# Altium integrated library Samtec_2,54_mm_Pitch_Socket_Strips.IntLib: 489 symbols (part 3 of 4) (continued)
## SSQ-107-02-F-D-RA (continued)
SQ Post Socket, Through-hole, Right Angle, -55 to 125 degC, 2.54 mm Pitch, 14-Pin, Female, RoHS; Manufacturer: Samtec; PartNumber: SSQ-107-02-F-D-RA; Pitch: 2.54 mm; DatasheetVersion: F-214; PackageVersion: BD, 6/1987; PackageReference: SSQ-107-02-X-D-RA; PackageDescription: Assembly, Socket Strip .025[0.64] SQ Tail; Orientation: Right Angle; RoHS: True; Temperature Range: -55 to 125 degC; Mounting Technology: Through-hole; ComponentLink1Description: Manufacturer URL; ComponentLink1URL: http://www.samtec.com; ComponentLink2Description: Datasheet; ComponentLink2URL: http://www.samtec.com/documents/webfiles/pdf/SSQ_TH.PDF; ComponentLink3Description: Package Specification; ComponentLink3URL: http://www.samtec.com/documents/webfiles/cpdf/SSQ-1XX-XX-XXX-X-XX-XXX-XX-X-MKT.pdf
footprint SMTC-SSQ-107-02-X-D-RA (SQ Post Socket, 2x7 Pins, Right Angle, 2.54mm Pitch, Female)
pins: 1, 2, 3, 4, 5, 6, 7, 8, 9, 10, 11, 12, 13, 14

## SSQ-107-02-G-D-RA
designator J?
SQ Post Socket, Through-hole, Right Angle, -55 to 125 degC, 2.54 mm Pitch, 14-Pin, Female, RoHS; Manufacturer: Samtec; PartNumber: SSQ-107-02-G-D-RA; Pitch: 2.54 mm; DatasheetVersion: F-214; PackageVersion: BD, 6/1987; PackageReference: SSQ-107-02-X-D-RA; PackageDescription: Assembly, Socket Strip .025[0.64] SQ Tail; Supplier 1: Digi-Key; Supplier Part Number 1: SAM1186-07-ND; Orientation: Right Angle; RoHS: True; Temperature Range: -55 to 125 degC; Mounting Technology: Through-hole; ComponentLink1Description: Manufacturer URL; ComponentLink1URL: http://www.samtec.com; ComponentLink2Description: Datasheet; ComponentLink2URL: http://www.samtec.com/documents/webfiles/pdf/SSQ_TH.PDF; ComponentLink3Description: Package Specification; ComponentLink3URL: http://www.samtec.com/documents/webfiles/cpdf/SSQ-1XX-XX-XXX-X-XX-XXX-XX-X-MKT.pdf
footprint SMTC-SSQ-107-02-X-D-RA (SQ Post Socket, 2x7 Pins, Right Angle, 2.54mm Pitch, Female)
pins: 1, 2, 3, 4, 5, 6, 7, 8, 9, 10, 11, 12, 13, 14

## SSQ-107-02-L-D-RA
designator J?
SQ Post Socket, Through-hole, Right Angle, -55 to 125 degC, 2.54 mm Pitch, 14-Pin, Female, RoHS; Manufacturer: Samtec; PartNumber: SSQ-107-02-L-D-RA; Pitch: 2.54 mm; DatasheetVersion: F-214; PackageVersion: BD, 6/1987; PackageReference: SSQ-107-02-X-D-RA; PackageDescription: Assembly, Socket Strip .025[0.64] SQ Tail; Orientation: Right Angle; RoHS: True; Temperature Range: -55 to 125 degC; Mounting Technology: Through-hole; ComponentLink1Description: Manufacturer URL; ComponentLink1URL: http://www.samtec.com; ComponentLink2Description: Datasheet; ComponentLink2URL: http://www.samtec.com/documents/webfiles/pdf/SSQ_TH.PDF; ComponentLink3Description: Package Specification; ComponentLink3URL: http://www.samtec.com/documents/webfiles/cpdf/SSQ-1XX-XX-XXX-X-XX-XXX-XX-X-MKT.pdf
footprint SMTC-SSQ-107-02-X-D-RA (SQ Post Socket, 2x7 Pins, Right Angle, 2.54mm Pitch, Female)
pins: 1, 2, 3, 4, 5, 6, 7, 8, 9, 10, 11, 12, 13, 14

## SSQ-107-02-T-D-RA
designator J?
SQ Post Socket, Through-hole, Right Angle, -55 to 105 degC, 2.54 mm Pitch, 14-Pin, Female, RoHS; Manufacturer: Samtec; PartNumber: SSQ-107-02-T-D-RA; Pitch: 2.54 mm; DatasheetVersion: F-214; PackageVersion: BD, 6/1987; PackageReference: SSQ-107-02-X-D-RA; PackageDescription: Assembly, Socket Strip .025[0.64] SQ Tail; Supplier 1: Digi-Key; Supplier Part Number 1: SAM1224-07-ND; Orientation: Right Angle; RoHS: True; Temperature Range: -55 to 105 degC; Mounting Technology: Through-hole; ComponentLink1Description: Manufacturer URL; ComponentLink1URL: http://www.samtec.com; ComponentLink2Description: Datasheet; ComponentLink2URL: http://www.samtec.com/documents/webfiles/pdf/SSQ_TH.PDF; ComponentLink3Description: Package Specification; ComponentLink3URL: http://www.samtec.com/documents/webfiles/cpdf/SSQ-1XX-XX-XXX-X-XX-XXX-XX-X-MKT.pdf
footprint SMTC-SSQ-107-02-X-D-RA (SQ Post Socket, 2x7 Pins, Right Angle, 2.54mm Pitch, Female)
pins: 1, 2, 3, 4, 5, 6, 7, 8, 9, 10, 11, 12, 13, 14

## SSQ-108-01-F-S
designator J?
SQ Post Socket, Through-hole, Vertical, -55 to 125 degC, 2.54 mm Pitch, 8-Pin, Female, RoHS; Manufacturer: Samtec; PartNumber: SSQ-108-01-F-S; Pitch: 2.54 mm; DatasheetVersion: F-214; PackageVersion: BD, 6/1987; PackageReference: SSQ-108-01-X-S; PackageDescription: Assembly, Socket Strip .025[0.64] SQ Tail; Orientation: Vertical; RoHS: True; Temperature Range: -55 to 125 degC; Mounting Technology: Through-hole; ComponentLink1Description: Manufacturer URL; ComponentLink1URL: http://www.samtec.com; ComponentLink2Description: Datasheet; ComponentLink2URL: http://www.samtec.com/documents/webfiles/pdf/SSQ_TH.PDF; ComponentLink3Description: Package Specification; ComponentLink3URL: http://www.samtec.com/documents/webfiles/cpdf/SSQ-1XX-XX-XXX-X-XX-XXX-XX-X-MKT.pdf
footprint SMTC-SSQ-108-01-X-S (SQ Post Socket, 1x8 Pins, Vertical, 2.54mm Pitch, Female)
pins: 1, 2, 3, 4, 5, 6, 7, 8

## SSQ-108-01-G-S
designator J?
SQ Post Socket, Through-hole, Vertical, -55 to 125 degC, 2.54 mm Pitch, 8-Pin, Female, RoHS; Manufacturer: Samtec; PartNumber: SSQ-108-01-G-S; Pitch: 2.54 mm; DatasheetVersion: F-214; PackageVersion: BD, 6/1987; PackageReference: SSQ-108-01-X-S; PackageDescription: Assembly, Socket Strip .025[0.64] SQ Tail; Supplier 1: Digi-Key; Supplier Part Number 1: SAM1180-08-ND; Supplier 2: Farnell; Supplier Part Number 2: 1668302; Supplier 3: Newark; Supplier Part Number 3: 11P8310; Orientation: Vertical; RoHS: True; Temperature Range: -55 to 125 degC; Mounting Technology: Through-hole; ComponentLink1Description: Manufacturer URL; ComponentLink1URL: http://www.samtec.com; ComponentLink2Description: Datasheet; ComponentLink2URL: http://www.samtec.com/documents/webfiles/pdf/SSQ_TH.PDF; ComponentLink3Description: Package Specification; ComponentLink3URL: http://www.samtec.com/documents/webfiles/cpdf/SSQ-1XX-XX-XXX-X-XX-XXX-XX-X-MKT.pdf
footprint SMTC-SSQ-108-01-X-S (SQ Post Socket, 1x8 Pins, Vertical, 2.54mm Pitch, Female)
pins: 1, 2, 3, 4, 5, 6, 7, 8

## SSQ-108-01-L-S
designator J?
SQ Post Socket, Through-hole, Vertical, -55 to 125 degC, 2.54 mm Pitch, 8-Pin, Female, RoHS; Manufacturer: Samtec; PartNumber: SSQ-108-01-L-S; Pitch: 2.54 mm; DatasheetVersion: F-214; PackageVersion: BD, 6/1987; PackageReference: SSQ-108-01-X-S; PackageDescription: Assembly, Socket Strip .025[0.64] SQ Tail; Orientation: Vertical; RoHS: True; Temperature Range: -55 to 125 degC; Mounting Technology: Through-hole; ComponentLink1Description: Manufacturer URL; ComponentLink1URL: http://www.samtec.com; ComponentLink2Description: Datasheet; ComponentLink2URL: http://www.samtec.com/documents/webfiles/pdf/SSQ_TH.PDF; ComponentLink3Description: Package Specification; ComponentLink3URL: http://www.samtec.com/documents/webfiles/cpdf/SSQ-1XX-XX-XXX-X-XX-XXX-XX-X-MKT.pdf
footprint SMTC-SSQ-108-01-X-S (SQ Post Socket, 1x8 Pins, Vertical, 2.54mm Pitch, Female)
pins: 1, 2, 3, 4, 5, 6, 7, 8

## SSQ-108-01-T-S
designator J?
SQ Post Socket, Through-hole, Vertical, -55 to 105 degC, 2.54 mm Pitch, 8-Pin, Female, RoHS; Manufacturer: Samtec; PartNumber: SSQ-108-01-T-S; Pitch: 2.54 mm; DatasheetVersion: F-214; PackageVersion: BD, 6/1987; PackageReference: SSQ-108-01-X-S; PackageDescription: Assembly, Socket Strip .025[0.64] SQ Tail; Supplier 1: Digi-Key; Supplier Part Number 1: SAM1184-08-ND; Orientation: Vertical; RoHS: True; Temperature Range: -55 to 105 degC; Mounting Technology: Through-hole; ComponentLink1Description: Manufacturer URL; ComponentLink1URL: http://www.samtec.com; ComponentLink2Description: Datasheet; ComponentLink2URL: http://www.samtec.com/documents/webfiles/pdf/SSQ_TH.PDF; ComponentLink3Description: Package Specification; ComponentLink3URL: http://www.samtec.com/documents/webfiles/cpdf/SSQ-1XX-XX-XXX-X-XX-XXX-XX-X-MKT.pdf
footprint SMTC-SSQ-108-01-X-S (SQ Post Socket, 1x8 Pins, Vertical, 2.54mm Pitch, Female)
pins: 1, 2, 3, 4, 5, 6, 7, 8

## SSQ-108-02-F-D
designator J?
SQ Post Socket, Through-hole, Vertical, -55 to 125 degC, 2.54 mm Pitch, 16-Pin, Female, RoHS; Manufacturer: Samtec; PartNumber: SSQ-108-02-F-D; Pitch: 2.54 mm; DatasheetVersion: F-214; PackageVersion: BD, 6/1987; PackageReference: SSQ-108-02-X-D; PackageDescription: Assembly, Socket Strip .025[0.64] SQ Tail; Orientation: Vertical; RoHS: True; Temperature Range: -55 to 125 degC; Mounting Technology: Through-hole; ComponentLink1Description: Manufacturer URL; ComponentLink1URL: http://www.samtec.com; ComponentLink2Description: Datasheet; ComponentLink2URL: http://www.samtec.com/documents/webfiles/pdf/SSQ_TH.PDF; ComponentLink3Description: Package Specification; ComponentLink3URL: http://www.samtec.com/documents/webfiles/cpdf/SSQ-1XX-XX-XXX-X-XX-XXX-XX-X-MKT.pdf
footprint SMTC-SSQ-108-02-X-D (SQ Post Socket, 2x8 Pins, Vertical, 2.54mm Pitch, Female)
pins: 1, 2, 3, 4, 5, 6, 7, 8, 9, 10, 11, 12, 13, 14, 15, 16

## SSQ-108-02-F-S-RA
designator J?
SQ Post Socket, Through-hole, Right Angle, -55 to 125 degC, 2.54 mm Pitch, 8-Pin, Female, RoHS; Manufacturer: Samtec; PartNumber: SSQ-108-02-F-S-RA; Pitch: 2.54 mm; DatasheetVersion: F-214; PackageVersion: BD, 6/1987; PackageReference: SSQ-108-02-F-S-RA; PackageDescription: Assembly, Socket Strip .025[0.64] SQ Tail; Supplier 1: Newark; Supplier Part Number 1: 81P8572; Orientation: Right Angle; RoHS: True; Temperature Range: -55 to 125 degC; Mounting Technology: Through-hole; ComponentLink1Description: Manufacturer URL; ComponentLink1URL: http://www.samtec.com; ComponentLink2Description: Datasheet; ComponentLink2URL: http://www.samtec.com/documents/webfiles/pdf/SSQ_TH.PDF; ComponentLink3Description: Package Specification; ComponentLink3URL: http://www.samtec.com/documents/webfiles/cpdf/SSQ-1XX-XX-XXX-X-XX-XXX-XX-X-MKT.pdf
footprint SMTC-SSQ-108-02-F-S-RA (SQ Post Socket, 1x8 Pins, Right Angle, 2.54mm Pitch, Female)
pins: 1, 2, 3, 4, 5, 6, 7, 8

## SSQ-108-02-G-D
designator J?
SQ Post Socket, Through-hole, Vertical, -55 to 125 degC, 2.54 mm Pitch, 16-Pin, Female, RoHS; Manufacturer: Samtec; PartNumber: SSQ-108-02-G-D; Pitch: 2.54 mm; DatasheetVersion: F-214; PackageVersion: BD, 6/1987; PackageReference: SSQ-108-02-X-D; PackageDescription: Assembly, Socket Strip .025[0.64] SQ Tail; Supplier 1: Digi-Key; Supplier Part Number 1: SAM1185-08-ND; Supplier 2: Newark; Supplier Part Number 2: 11P8315; Orientation: Vertical; RoHS: True; Temperature Range: -55 to 125 degC; Mounting Technology: Through-hole; ComponentLink1Description: Manufacturer URL; ComponentLink1URL: http://www.samtec.com; ComponentLink2Description: Datasheet; ComponentLink2URL: http://www.samtec.com/documents/webfiles/pdf/SSQ_TH.PDF; ComponentLink3Description: Package Specification; ComponentLink3URL: http://www.samtec.com/documents/webfiles/cpdf/SSQ-1XX-XX-XXX-X-XX-XXX-XX-X-MKT.pdf
footprint SMTC-SSQ-108-02-X-D (SQ Post Socket, 2x8 Pins, Vertical, 2.54mm Pitch, Female)
pins: 1, 2, 3, 4, 5, 6, 7, 8, 9, 10, 11, 12, 13, 14, 15, 16

## SSQ-108-02-L-D
designator J?
SQ Post Socket, Through-hole, Vertical, -55 to 125 degC, 2.54 mm Pitch, 16-Pin, Female, RoHS; Manufacturer: Samtec; PartNumber: SSQ-108-02-L-D; Pitch: 2.54 mm; DatasheetVersion: F-214; PackageVersion: BD, 6/1987; PackageReference: SSQ-108-02-X-D; PackageDescription: Assembly, Socket Strip .025[0.64] SQ Tail; Orientation: Vertical; RoHS: True; Temperature Range: -55 to 125 degC; Mounting Technology: Through-hole; ComponentLink1Description: Manufacturer URL; ComponentLink1URL: http://www.samtec.com; ComponentLink2Description: Datasheet; ComponentLink2URL: http://www.samtec.com/documents/webfiles/pdf/SSQ_TH.PDF; ComponentLink3Description: Package Specification; ComponentLink3URL: http://www.samtec.com/documents/webfiles/cpdf/SSQ-1XX-XX-XXX-X-XX-XXX-XX-X-MKT.pdf
footprint SMTC-SSQ-108-02-X-D (SQ Post Socket, 2x8 Pins, Vertical, 2.54mm Pitch, Female)
pins: 1, 2, 3, 4, 5, 6, 7, 8, 9, 10, 11, 12, 13, 14, 15, 16

## SSQ-108-02-T-D
designator J?
SQ Post Socket, Through-hole, Vertical, -55 to 105 degC, 2.54 mm Pitch, 16-Pin, Female, RoHS; Manufacturer: Samtec; PartNumber: SSQ-108-02-T-D; Pitch: 2.54 mm; DatasheetVersion: F-214; PackageVersion: BD, 6/1987; PackageReference: SSQ-108-02-X-D; PackageDescription: Assembly, Socket Strip .025[0.64] SQ Tail; Supplier 1: Digi-Key; Supplier Part Number 1: SAM1193-08-ND; Orientation: Vertical; RoHS: True; Temperature Range: -55 to 105 degC; Mounting Technology: Through-hole; ComponentLink1Description: Manufacturer URL; ComponentLink1URL: http://www.samtec.com; ComponentLink2Description: Datasheet; ComponentLink2URL: http://www.samtec.com/documents/webfiles/pdf/SSQ_TH.PDF; ComponentLink3Description: Package Specification; ComponentLink3URL: http://www.samtec.com/documents/webfiles/cpdf/SSQ-1XX-XX-XXX-X-XX-XXX-XX-X-MKT.pdf
footprint SMTC-SSQ-108-02-X-D (SQ Post Socket, 2x8 Pins, Vertical, 2.54mm Pitch, Female)
pins: 1, 2, 3, 4, 5, 6, 7, 8, 9, 10, 11, 12, 13, 14, 15, 16

## SSQ-113-21-F-D
designator J?
SQ Post Socket, Through-hole, Vertical, -55 to 125 degC, 2.54 mm Pitch, 26-Pin, Female, RoHS; Manufacturer: Samtec; PartNumber: SSQ-113-21-F-D; Pitch: 2.54 mm; DatasheetVersion: F-214; PackageVersion: BD, 6/1987; PackageReference: SSQ-113-21-X-D; PackageDescription: Assembly, Socket Strip .025[0.64] SQ Tail; Supplier 1: Newark; Supplier Part Number 1: 81P9277; Orientation: Vertical; RoHS: True; Temperature Range: -55 to 125 degC; Mounting Technology: Through-hole; ComponentLink1Description: Manufacturer URL; ComponentLink1URL: http://www.samtec.com; ComponentLink2Description: Datasheet; ComponentLink2URL: http://www.samtec.com/documents/webfiles/pdf/SSQ_TH.PDF; ComponentLink3Description: Package Specification; ComponentLink3URL: http://www.samtec.com/documents/webfiles/cpdf/SSQ-1XX-XX-XXX-X-XX-XXX-XX-X-MKT.pdf
footprint SMTC-SSQ-113-21-X-D (SQ Post Socket, 2x13 Pins, Vertical, 2.54mm Pitch, Female)
pins: 1, 2, 3, 4, 5, 6, 7, 8, 9, 10, 11, 12, 13, 14, 15, 16, 17, 18, 19, 20, 21, 22, 23, 24, 25, 26

## SSQ-113-21-G-D
designator J?
SQ Post Socket, Through-hole, Vertical, -55 to 125 degC, 2.54 mm Pitch, 26-Pin, Female, RoHS; Manufacturer: Samtec; PartNumber: SSQ-113-21-G-D; Pitch: 2.54 mm; DatasheetVersion: F-214; PackageVersion: BD, 6/1987; PackageReference: SSQ-113-21-X-D; PackageDescription: Assembly, Socket Strip .025[0.64] SQ Tail; Orientation: Vertical; RoHS: True; Temperature Range: -55 to 125 degC; Mounting Technology: Through-hole; ComponentLink1Description: Manufacturer URL; ComponentLink1URL: http://www.samtec.com; ComponentLink2Description: Datasheet; ComponentLink2URL: http://www.samtec.com/documents/webfiles/pdf/SSQ_TH.PDF; ComponentLink3Description: Package Specification; ComponentLink3URL: http://www.samtec.com/documents/webfiles/cpdf/SSQ-1XX-XX-XXX-X-XX-XXX-XX-X-MKT.pdf
footprint SMTC-SSQ-113-21-X-D (SQ Post Socket, 2x13 Pins, Vertical, 2.54mm Pitch, Female)
pins: 1, 2, 3, 4, 5, 6, 7, 8, 9, 10, 11, 12, 13, 14, 15, 16, 17, 18, 19, 20, 21, 22, 23, 24, 25, 26

## SSQ-113-21-L-D
designator J?
SQ Post Socket, Through-hole, Vertical, -55 to 125 degC, 2.54 mm Pitch, 26-Pin, Female, RoHS; Manufacturer: Samtec; PartNumber: SSQ-113-21-L-D; Pitch: 2.54 mm; DatasheetVersion: F-214; PackageVersion: BD, 6/1987; PackageReference: SSQ-113-21-X-D; PackageDescription: Assembly, Socket Strip .025[0.64] SQ Tail; Orientation: Vertical; RoHS: True; Temperature Range: -55 to 125 degC; Mounting Technology: Through-hole; ComponentLink1Description: Manufacturer URL; ComponentLink1URL: http://www.samtec.com; ComponentLink2Description: Datasheet; ComponentLink2URL: http://www.samtec.com/documents/webfiles/pdf/SSQ_TH.PDF; ComponentLink3Description: Package Specification; ComponentLink3URL: http://www.samtec.com/documents/webfiles/cpdf/SSQ-1XX-XX-XXX-X-XX-XXX-XX-X-MKT.pdf
footprint SMTC-SSQ-113-21-X-D (SQ Post Socket, 2x13 Pins, Vertical, 2.54mm Pitch, Female)
pins: 1, 2, 3, 4, 5, 6, 7, 8, 9, 10, 11, 12, 13, 14, 15, 16, 17, 18, 19, 20, 21, 22, 23, 24, 25, 26

## SSQ-113-21-T-D
designator J?
SQ Post Socket, Through-hole, Vertical, -55 to 105 degC, 2.54 mm Pitch, 26-Pin, Female, RoHS; Manufacturer: Samtec; PartNumber: SSQ-113-21-T-D; Pitch: 2.54 mm; DatasheetVersion: F-214; PackageVersion: BD, 6/1987; PackageReference: SSQ-113-21-X-D; PackageDescription: Assembly, Socket Strip .025[0.64] SQ Tail; Orientation: Vertical; RoHS: True; Temperature Range: -55 to 105 degC; Mounting Technology: Through-hole; ComponentLink1Description: Manufacturer URL; ComponentLink1URL: http://www.samtec.com; ComponentLink2Description: Datasheet; ComponentLink2URL: http://www.samtec.com/documents/webfiles/pdf/SSQ_TH.PDF; ComponentLink3Description: Package Specification; ComponentLink3URL: http://www.samtec.com/documents/webfiles/cpdf/SSQ-1XX-XX-XXX-X-XX-XXX-XX-X-MKT.pdf
footprint SMTC-SSQ-113-21-X-D (SQ Post Socket, 2x13 Pins, Vertical, 2.54mm Pitch, Female)
pins: 1, 2, 3, 4, 5, 6, 7, 8, 9, 10, 11, 12, 13, 14, 15, 16, 17, 18, 19, 20, 21, 22, 23, 24, 25, 26

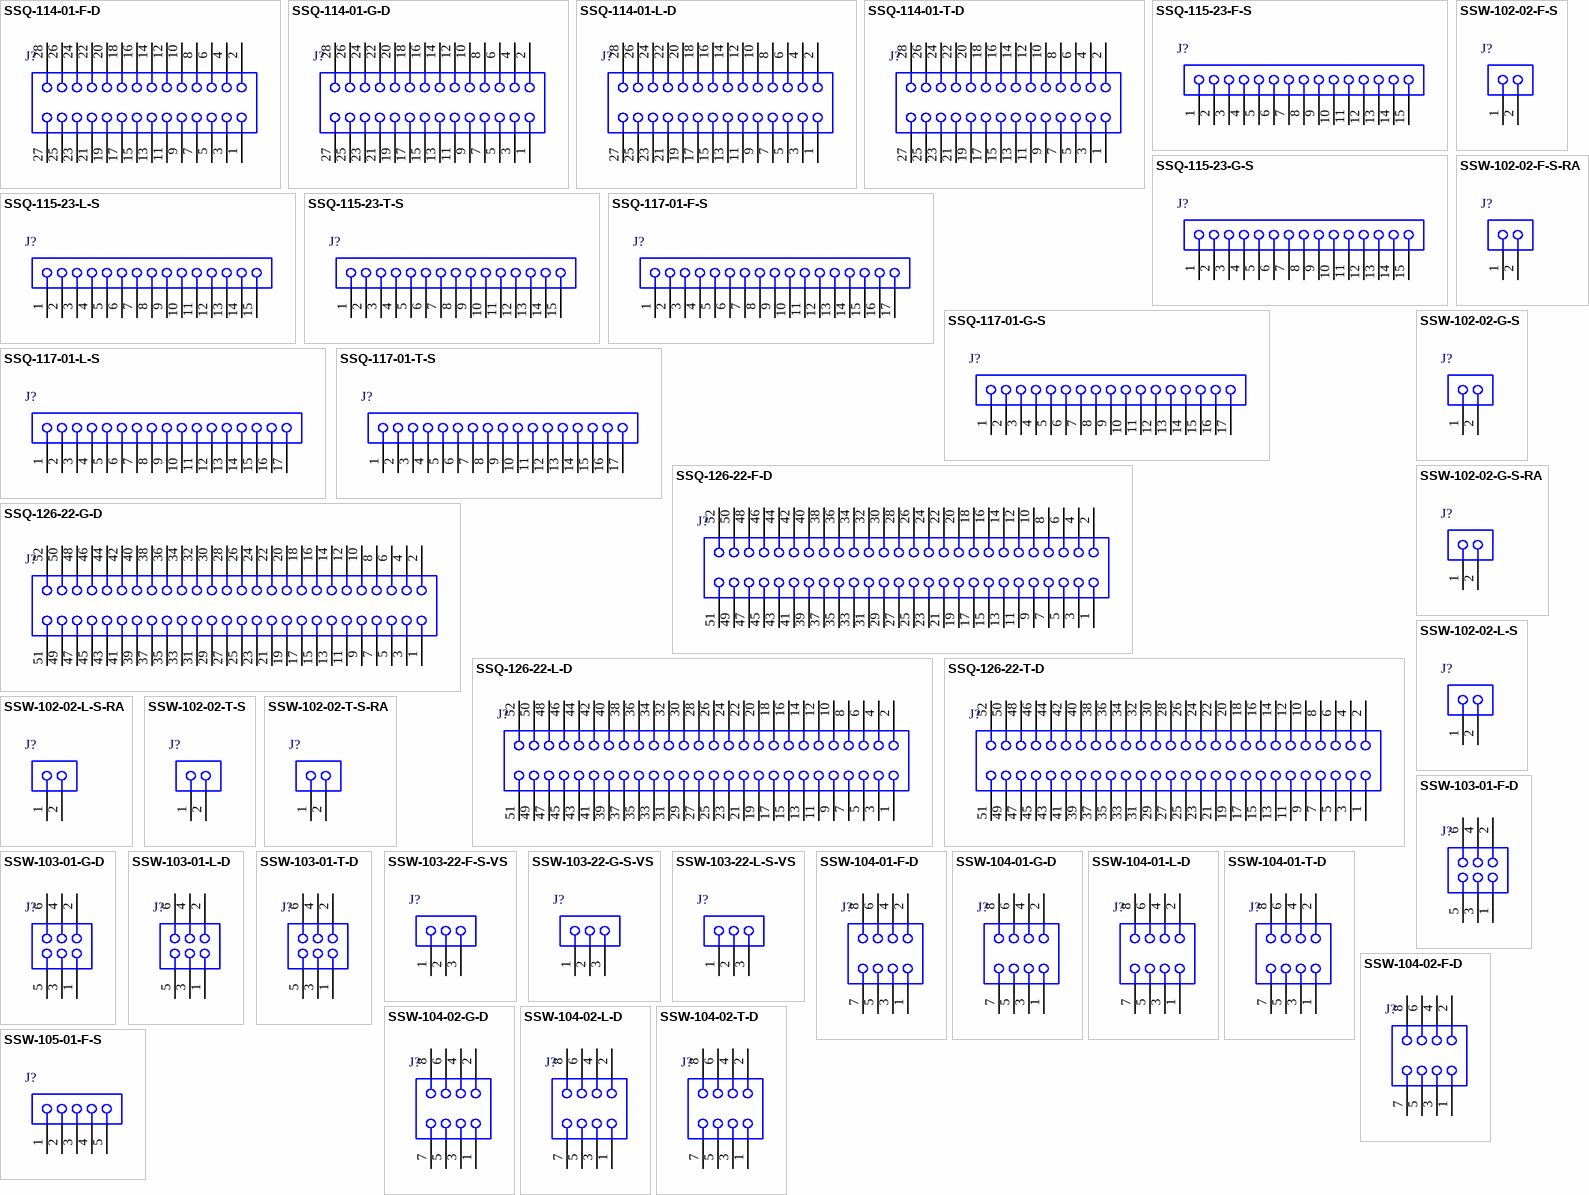
[diagram p8: symbols SSQ-114-01-F-D to SSW-105-01-F-S]

## SSQ-114-01-F-D
designator J?
SQ Post Socket, Through-hole, Vertical, -55 to 125 degC, 2.54 mm Pitch, 28-Pin, Female, RoHS; Manufacturer: Samtec; PartNumber: SSQ-114-01-F-D; Pitch: 2.54 mm; DatasheetVersion: F-214; PackageVersion: BD, 6/1987; PackageReference: SSQ-114-01-X-D; PackageDescription: Assembly, Socket Strip .025[0.64] SQ Tail; Orientation: Vertical; RoHS: True; Temperature Range: -55 to 125 degC; Mounting Technology: Through-hole; ComponentLink1Description: Manufacturer URL; ComponentLink1URL: http://www.samtec.com; ComponentLink2Description: Datasheet; ComponentLink2URL: http://www.samtec.com/documents/webfiles/pdf/SSQ_TH.PDF; ComponentLink3Description: Package Specification; ComponentLink3URL: http://www.samtec.com/documents/webfiles/cpdf/SSQ-1XX-XX-XXX-X-XX-XXX-XX-X-MKT.pdf
footprint SMTC-SSQ-114-01-X-D (SQ Post Socket, 2x14 Pins, Vertical, 2.54mm Pitch, Female)
pins: 1, 2, 3, 4, 5, 6, 7, 8, 9, 10, 11, 12, 13, 14, 15, 16, 17, 18, 19, 20, 21, 22, 23, 24, 25, 26, 27, 28

## SSQ-114-01-G-D
designator J?
SQ Post Socket, Through-hole, Vertical, -55 to 125 degC, 2.54 mm Pitch, 28-Pin, Female, RoHS; Manufacturer: Samtec; PartNumber: SSQ-114-01-G-D; Pitch: 2.54 mm; DatasheetVersion: F-214; PackageVersion: BD, 6/1987; PackageReference: SSQ-114-01-X-D; PackageDescription: Assembly, Socket Strip .025[0.64] SQ Tail; Supplier 1: Digi-Key; Supplier Part Number 1: SAM1179-14-ND; Orientation: Vertical; RoHS: True; Temperature Range: -55 to 125 degC; Mounting Technology: Through-hole; ComponentLink1Description: Manufacturer URL; ComponentLink1URL: http://www.samtec.com; ComponentLink2Description: Datasheet; ComponentLink2URL: http://www.samtec.com/documents/webfiles/pdf/SSQ_TH.PDF; ComponentLink3Description: Package Specification; ComponentLink3URL: http://www.samtec.com/documents/webfiles/cpdf/SSQ-1XX-XX-XXX-X-XX-XXX-XX-X-MKT.pdf
footprint SMTC-SSQ-114-01-X-D (SQ Post Socket, 2x14 Pins, Vertical, 2.54mm Pitch, Female)
pins: 1, 2, 3, 4, 5, 6, 7, 8, 9, 10, 11, 12, 13, 14, 15, 16, 17, 18, 19, 20, 21, 22, 23, 24, 25, 26, 27, 28

## SSQ-114-01-L-D
designator J?
SQ Post Socket, Through-hole, Vertical, -55 to 125 degC, 2.54 mm Pitch, 28-Pin, Female, RoHS; Manufacturer: Samtec; PartNumber: SSQ-114-01-L-D; Pitch: 2.54 mm; DatasheetVersion: F-214; PackageVersion: BD, 6/1987; PackageReference: SSQ-114-01-X-D; PackageDescription: Assembly, Socket Strip .025[0.64] SQ Tail; Orientation: Vertical; RoHS: True; Temperature Range: -55 to 125 degC; Mounting Technology: Through-hole; ComponentLink1Description: Manufacturer URL; ComponentLink1URL: http://www.samtec.com; ComponentLink2Description: Datasheet; ComponentLink2URL: http://www.samtec.com/documents/webfiles/pdf/SSQ_TH.PDF; ComponentLink3Description: Package Specification; ComponentLink3URL: http://www.samtec.com/documents/webfiles/cpdf/SSQ-1XX-XX-XXX-X-XX-XXX-XX-X-MKT.pdf
footprint SMTC-SSQ-114-01-X-D (SQ Post Socket, 2x14 Pins, Vertical, 2.54mm Pitch, Female)
pins: 1, 2, 3, 4, 5, 6, 7, 8, 9, 10, 11, 12, 13, 14, 15, 16, 17, 18, 19, 20, 21, 22, 23, 24, 25, 26, 27, 28

## SSQ-114-01-T-D
designator J?
SQ Post Socket, Through-hole, Vertical, -55 to 105 degC, 2.54 mm Pitch, 28-Pin, Female, RoHS; Manufacturer: Samtec; PartNumber: SSQ-114-01-T-D; Pitch: 2.54 mm; DatasheetVersion: F-214; PackageVersion: BD, 6/1987; PackageReference: SSQ-114-01-X-D; PackageDescription: Assembly, Socket Strip .025[0.64] SQ Tail; Supplier 1: Digi-Key; Supplier Part Number 1: SAM1183-14-ND; Orientation: Vertical; RoHS: True; Temperature Range: -55 to 105 degC; Mounting Technology: Through-hole; ComponentLink1Description: Manufacturer URL; ComponentLink1URL: http://www.samtec.com; ComponentLink2Description: Datasheet; ComponentLink2URL: http://www.samtec.com/documents/webfiles/pdf/SSQ_TH.PDF; ComponentLink3Description: Package Specification; ComponentLink3URL: http://www.samtec.com/documents/webfiles/cpdf/SSQ-1XX-XX-XXX-X-XX-XXX-XX-X-MKT.pdf
footprint SMTC-SSQ-114-01-X-D (SQ Post Socket, 2x14 Pins, Vertical, 2.54mm Pitch, Female)
pins: 1, 2, 3, 4, 5, 6, 7, 8, 9, 10, 11, 12, 13, 14, 15, 16, 17, 18, 19, 20, 21, 22, 23, 24, 25, 26, 27, 28

## SSQ-115-23-F-S
designator J?
SQ Post Socket, Through-hole, Vertical, -55 to 125 degC, 2.54 mm Pitch, 15-Pin, Female, RoHS; Manufacturer: Samtec; PartNumber: SSQ-115-23-F-S; Pitch: 2.54 mm; DatasheetVersion: F-214; PackageVersion: BD, 6/1987; PackageReference: SSQ-115-23-X-S; PackageDescription: Assembly, Socket Strip .025[0.64] SQ Tail; Orientation: Vertical; RoHS: True; Temperature Range: -55 to 125 degC; Mounting Technology: Through-hole; ComponentLink1Description: Manufacturer URL; ComponentLink1URL: http://www.samtec.com; ComponentLink2Description: Datasheet; ComponentLink2URL: http://www.samtec.com/documents/webfiles/pdf/SSQ_TH.PDF; ComponentLink3Description: Package Specification; ComponentLink3URL: http://www.samtec.com/documents/webfiles/cpdf/SSQ-1XX-XX-XXX-X-XX-XXX-XX-X-MKT.pdf
footprint SMTC-SSQ-115-23-X-S (SQ Post Socket, 1x15 Pins, Vertical, 2.54mm Pitch, Female)
pins: 1, 2, 3, 4, 5, 6, 7, 8, 9, 10, 11, 12, 13, 14, 15

## SSQ-115-23-G-S
designator J?
SQ Post Socket, Through-hole, Vertical, -55 to 125 degC, 2.54 mm Pitch, 15-Pin, Female, RoHS; Manufacturer: Samtec; PartNumber: SSQ-115-23-G-S; Pitch: 2.54 mm; DatasheetVersion: F-214; PackageVersion: BD, 6/1987; PackageReference: SSQ-115-23-X-S; PackageDescription: Assembly, Socket Strip .025[0.64] SQ Tail; Orientation: Vertical; RoHS: True; Temperature Range: -55 to 125 degC; Mounting Technology: Through-hole; ComponentLink1Description: Manufacturer URL; ComponentLink1URL: http://www.samtec.com; ComponentLink2Description: Datasheet; ComponentLink2URL: http://www.samtec.com/documents/webfiles/pdf/SSQ_TH.PDF; ComponentLink3Description: Package Specification; ComponentLink3URL: http://www.samtec.com/documents/webfiles/cpdf/SSQ-1XX-XX-XXX-X-XX-XXX-XX-X-MKT.pdf
footprint SMTC-SSQ-115-23-X-S (SQ Post Socket, 1x15 Pins, Vertical, 2.54mm Pitch, Female)
pins: 1, 2, 3, 4, 5, 6, 7, 8, 9, 10, 11, 12, 13, 14, 15

## SSQ-115-23-L-S
designator J?
SQ Post Socket, Through-hole, Vertical, -55 to 125 degC, 2.54 mm Pitch, 15-Pin, Female, RoHS; Manufacturer: Samtec; PartNumber: SSQ-115-23-L-S; Pitch: 2.54 mm; DatasheetVersion: F-214; PackageVersion: BD, 6/1987; PackageReference: SSQ-115-23-X-S; PackageDescription: Assembly, Socket Strip .025[0.64] SQ Tail; Orientation: Vertical; RoHS: True; Temperature Range: -55 to 125 degC; Mounting Technology: Through-hole; ComponentLink1Description: Manufacturer URL; ComponentLink1URL: http://www.samtec.com; ComponentLink2Description: Datasheet; ComponentLink2URL: http://www.samtec.com/documents/webfiles/pdf/SSQ_TH.PDF; ComponentLink3Description: Package Specification; ComponentLink3URL: http://www.samtec.com/documents/webfiles/cpdf/SSQ-1XX-XX-XXX-X-XX-XXX-XX-X-MKT.pdf
footprint SMTC-SSQ-115-23-X-S (SQ Post Socket, 1x15 Pins, Vertical, 2.54mm Pitch, Female)
pins: 1, 2, 3, 4, 5, 6, 7, 8, 9, 10, 11, 12, 13, 14, 15

## SSQ-115-23-T-S
designator J?
SQ Post Socket, Through-hole, Vertical, -55 to 105 degC, 2.54 mm Pitch, 15-Pin, Female, RoHS; Manufacturer: Samtec; PartNumber: SSQ-115-23-T-S; Pitch: 2.54 mm; DatasheetVersion: F-214; PackageVersion: BD, 6/1987; PackageReference: SSQ-115-23-X-S; PackageDescription: Assembly, Socket Strip .025[0.64] SQ Tail; Orientation: Vertical; RoHS: True; Temperature Range: -55 to 105 degC; Mounting Technology: Through-hole; ComponentLink1Description: Manufacturer URL; ComponentLink1URL: http://www.samtec.com; ComponentLink2Description: Datasheet; ComponentLink2URL: http://www.samtec.com/documents/webfiles/pdf/SSQ_TH.PDF; ComponentLink3Description: Package Specification; ComponentLink3URL: http://www.samtec.com/documents/webfiles/cpdf/SSQ-1XX-XX-XXX-X-XX-XXX-XX-X-MKT.pdf
footprint SMTC-SSQ-115-23-X-S (SQ Post Socket, 1x15 Pins, Vertical, 2.54mm Pitch, Female)
pins: 1, 2, 3, 4, 5, 6, 7, 8, 9, 10, 11, 12, 13, 14, 15

## SSQ-117-01-F-S
designator J?
SQ Post Socket, Through-hole, Vertical, -55 to 125 degC, 2.54 mm Pitch, 17-Pin, Female, RoHS; Manufacturer: Samtec; PartNumber: SSQ-117-01-F-S; Pitch: 2.54 mm; DatasheetVersion: F-214; PackageVersion: BD, 6/1987; PackageReference: SSQ-117-01-X-S; PackageDescription: Assembly, Socket Strip .025[0.64] SQ Tail; Orientation: Vertical; RoHS: True; Temperature Range: -55 to 125 degC; Mounting Technology: Through-hole; ComponentLink1Description: Manufacturer URL; ComponentLink1URL: http://www.samtec.com; ComponentLink2Description: Datasheet; ComponentLink2URL: http://www.samtec.com/documents/webfiles/pdf/SSQ_TH.PDF; ComponentLink3Description: Package Specification; ComponentLink3URL: http://www.samtec.com/documents/webfiles/cpdf/SSQ-1XX-XX-XXX-X-XX-XXX-XX-X-MKT.pdf
footprint SMTC-SSQ-117-01-X-S (SQ Post Socket, 1x17 Pins, Vertical, 2.54mm Pitch, Female)
pins: 1, 2, 3, 4, 5, 6, 7, 8, 9, 10, 11, 12, 13, 14, 15, 16, 17

## SSQ-117-01-G-S
designator J?
SQ Post Socket, Through-hole, Vertical, -55 to 125 degC, 2.54 mm Pitch, 17-Pin, Female, RoHS; Manufacturer: Samtec; PartNumber: SSQ-117-01-G-S; Pitch: 2.54 mm; DatasheetVersion: F-214; PackageVersion: BD, 6/1987; PackageReference: SSQ-117-01-X-S; PackageDescription: Assembly, Socket Strip .025[0.64] SQ Tail; Supplier 1: Digi-Key; Supplier Part Number 1: SAM1180-17-ND; Orientation: Vertical; RoHS: True; Temperature Range: -55 to 125 degC; Mounting Technology: Through-hole; ComponentLink1Description: Manufacturer URL; ComponentLink1URL: http://www.samtec.com; ComponentLink2Description: Datasheet; ComponentLink2URL: http://www.samtec.com/documents/webfiles/pdf/SSQ_TH.PDF; ComponentLink3Description: Package Specification; ComponentLink3URL: http://www.samtec.com/documents/webfiles/cpdf/SSQ-1XX-XX-XXX-X-XX-XXX-XX-X-MKT.pdf
footprint SMTC-SSQ-117-01-X-S (SQ Post Socket, 1x17 Pins, Vertical, 2.54mm Pitch, Female)
pins: 1, 2, 3, 4, 5, 6, 7, 8, 9, 10, 11, 12, 13, 14, 15, 16, 17

## SSQ-117-01-L-S
designator J?
SQ Post Socket, Through-hole, Vertical, -55 to 125 degC, 2.54 mm Pitch, 17-Pin, Female, RoHS; Manufacturer: Samtec; PartNumber: SSQ-117-01-L-S; Pitch: 2.54 mm; DatasheetVersion: F-214; PackageVersion: BD, 6/1987; PackageReference: SSQ-117-01-X-S; PackageDescription: Assembly, Socket Strip .025[0.64] SQ Tail; Orientation: Vertical; RoHS: True; Temperature Range: -55 to 125 degC; Mounting Technology: Through-hole; ComponentLink1Description: Manufacturer URL; ComponentLink1URL: http://www.samtec.com; ComponentLink2Description: Datasheet; ComponentLink2URL: http://www.samtec.com/documents/webfiles/pdf/SSQ_TH.PDF; ComponentLink3Description: Package Specification; ComponentLink3URL: http://www.samtec.com/documents/webfiles/cpdf/SSQ-1XX-XX-XXX-X-XX-XXX-XX-X-MKT.pdf
footprint SMTC-SSQ-117-01-X-S (SQ Post Socket, 1x17 Pins, Vertical, 2.54mm Pitch, Female)
pins: 1, 2, 3, 4, 5, 6, 7, 8, 9, 10, 11, 12, 13, 14, 15, 16, 17

## SSQ-117-01-T-S
designator J?
SQ Post Socket, Through-hole, Vertical, -55 to 105 degC, 2.54 mm Pitch, 17-Pin, Female, RoHS; Manufacturer: Samtec; PartNumber: SSQ-117-01-T-S; Pitch: 2.54 mm; DatasheetVersion: F-214; PackageVersion: BD, 6/1987; PackageReference: SSQ-117-01-X-S; PackageDescription: Assembly, Socket Strip .025[0.64] SQ Tail; Supplier 1: Digi-Key; Supplier Part Number 1: SAM1184-17-ND; Orientation: Vertical; RoHS: True; Temperature Range: -55 to 105 degC; Mounting Technology: Through-hole; ComponentLink1Description: Manufacturer URL; ComponentLink1URL: http://www.samtec.com; ComponentLink2Description: Datasheet; ComponentLink2URL: http://www.samtec.com/documents/webfiles/pdf/SSQ_TH.PDF; ComponentLink3Description: Package Specification; ComponentLink3URL: http://www.samtec.com/documents/webfiles/cpdf/SSQ-1XX-XX-XXX-X-XX-XXX-XX-X-MKT.pdf
footprint SMTC-SSQ-117-01-X-S (SQ Post Socket, 1x17 Pins, Vertical, 2.54mm Pitch, Female)
pins: 1, 2, 3, 4, 5, 6, 7, 8, 9, 10, 11, 12, 13, 14, 15, 16, 17

## SSQ-126-22-F-D
designator J?
SQ Post Socket, Through-hole, Vertical, -55 to 125 degC, 2.54 mm Pitch, 52-Pin, Female, RoHS; Manufacturer: Samtec; PartNumber: SSQ-126-22-F-D; Pitch: 2.54 mm; DatasheetVersion: F-214; PackageVersion: BD, 6/1987; PackageReference: SSQ-126-22-X-D; PackageDescription: Assembly, Socket Strip .025[0.64] SQ Tail; Orientation: Vertical; RoHS: True; Temperature Range: -55 to 125 degC; Mounting Technology: Through-hole; ComponentLink1Description: Manufacturer URL; ComponentLink1URL: http://www.samtec.com; ComponentLink2Description: Datasheet; ComponentLink2URL: http://www.samtec.com/documents/webfiles/pdf/SSQ_TH.PDF; ComponentLink3Description: Package Specification; ComponentLink3URL: http://www.samtec.com/documents/webfiles/cpdf/SSQ-1XX-XX-XXX-X-XX-XXX-XX-X-MKT.pdf
footprint SMTC-SSQ-126-22-X-D (SQ Post Socket, 2x26 Pins, Vertical, 2.54mm Pitch, Female)
pins: 1, 2, 3, 4, 5, 6, 7, 8, 9, 10, 11, 12, 13, 14, 15, 16, 17, 18, 19, 20, 21, 22, 23, 24, 25, 26, 27, 28, 29, 30, 31, 32, 33, 34, 35, 36, 37, 38, 39, 40, 41, 42, 43, 44, 45, 46, 47, 48, 49, 50, 51, 52

## SSQ-126-22-G-D
designator J?
SQ Post Socket, Through-hole, Vertical, -55 to 125 degC, 2.54 mm Pitch, 52-Pin, Female, RoHS; Manufacturer: Samtec; PartNumber: SSQ-126-22-G-D; Pitch: 2.54 mm; DatasheetVersion: F-214; PackageVersion: BD, 6/1987; PackageReference: SSQ-126-22-X-D; PackageDescription: Assembly, Socket Strip .025[0.64] SQ Tail; Supplier 1: Newark; Supplier Part Number 1: 82P0494; Orientation: Vertical; RoHS: True; Temperature Range: -55 to 125 degC; Mounting Technology: Through-hole; ComponentLink1Description: Manufacturer URL; ComponentLink1URL: http://www.samtec.com; ComponentLink2Description: Datasheet; ComponentLink2URL: http://www.samtec.com/documents/webfiles/pdf/SSQ_TH.PDF; ComponentLink3Description: Package Specification; ComponentLink3URL: http://www.samtec.com/documents/webfiles/cpdf/SSQ-1XX-XX-XXX-X-XX-XXX-XX-X-MKT.pdf
footprint SMTC-SSQ-126-22-X-D (SQ Post Socket, 2x26 Pins, Vertical, 2.54mm Pitch, Female)
pins: 1, 2, 3, 4, 5, 6, 7, 8, 9, 10, 11, 12, 13, 14, 15, 16, 17, 18, 19, 20, 21, 22, 23, 24, 25, 26, 27, 28, 29, 30, 31, 32, 33, 34, 35, 36, 37, 38, 39, 40, 41, 42, 43, 44, 45, 46, 47, 48, 49, 50, 51, 52

## SSQ-126-22-L-D
designator J?
SQ Post Socket, Through-hole, Vertical, -55 to 125 degC, 2.54 mm Pitch, 52-Pin, Female, RoHS; Manufacturer: Samtec; PartNumber: SSQ-126-22-L-D; Pitch: 2.54 mm; DatasheetVersion: F-214; PackageVersion: BD, 6/1987; PackageReference: SSQ-126-22-X-D; PackageDescription: Assembly, Socket Strip .025[0.64] SQ Tail; Orientation: Vertical; RoHS: True; Temperature Range: -55 to 125 degC; Mounting Technology: Through-hole; ComponentLink1Description: Manufacturer URL; ComponentLink1URL: http://www.samtec.com; ComponentLink2Description: Datasheet; ComponentLink2URL: http://www.samtec.com/documents/webfiles/pdf/SSQ_TH.PDF; ComponentLink3Description: Package Specification; ComponentLink3URL: http://www.samtec.com/documents/webfiles/cpdf/SSQ-1XX-XX-XXX-X-XX-XXX-XX-X-MKT.pdf
footprint SMTC-SSQ-126-22-X-D (SQ Post Socket, 2x26 Pins, Vertical, 2.54mm Pitch, Female)
pins: 1, 2, 3, 4, 5, 6, 7, 8, 9, 10, 11, 12, 13, 14, 15, 16, 17, 18, 19, 20, 21, 22, 23, 24, 25, 26, 27, 28, 29, 30, 31, 32, 33, 34, 35, 36, 37, 38, 39, 40, 41, 42, 43, 44, 45, 46, 47, 48, 49, 50, 51, 52

## SSQ-126-22-T-D
designator J?
SQ Post Socket, Through-hole, Vertical, -55 to 105 degC, 2.54 mm Pitch, 52-Pin, Female, RoHS; Manufacturer: Samtec; PartNumber: SSQ-126-22-T-D; Pitch: 2.54 mm; DatasheetVersion: F-214; PackageVersion: BD, 6/1987; PackageReference: SSQ-126-22-X-D; PackageDescription: Assembly, Socket Strip .025[0.64] SQ Tail; Orientation: Vertical; RoHS: True; Temperature Range: -55 to 105 degC; Mounting Technology: Through-hole; ComponentLink1Description: Manufacturer URL; ComponentLink1URL: http://www.samtec.com; ComponentLink2Description: Datasheet; ComponentLink2URL: http://www.samtec.com/documents/webfiles/pdf/SSQ_TH.PDF; ComponentLink3Description: Package Specification; ComponentLink3URL: http://www.samtec.com/documents/webfiles/cpdf/SSQ-1XX-XX-XXX-X-XX-XXX-XX-X-MKT.pdf
footprint SMTC-SSQ-126-22-X-D (SQ Post Socket, 2x26 Pins, Vertical, 2.54mm Pitch, Female)
pins: 1, 2, 3, 4, 5, 6, 7, 8, 9, 10, 11, 12, 13, 14, 15, 16, 17, 18, 19, 20, 21, 22, 23, 24, 25, 26, 27, 28, 29, 30, 31, 32, 33, 34, 35, 36, 37, 38, 39, 40, 41, 42, 43, 44, 45, 46, 47, 48, 49, 50, 51, 52